# Altium schematic symbol library TI Amplifiers and Linear Operational Amplifier High Speed.SchLib: 1100 symbols (part 4 of 25) (continued)
## OPA842ID
designator U?
Wideband, Low Distortion, Unity Gain Stable, Voltage Feedback Operational Amplifier, 7 to 12 V, -40 to 85 degC, 8-pin SOIC (D8), Green (RoHS & no Sb/Br); Manufacturer: Texas Instruments; PartNumber: OPA842ID; 2nd Harmonic(dBc): 94; 3rd Harmonic(dBc): 93; @ MHz: 5; Acl, min stable gain(V/V): 1; BW @ Acl(MHz): 400; Diff Gain(%): 0.003; Diff Phase(deg): 0.008; Iib(Max)(nA): 37000; Io(Typ)(mA): 100; Iq per channel(Max)(mA): 22.5; Settling Time (0.1%)(Typ)(ns): 15; Sub Family: High Output Current Amplifier (>=50mA), High Speed Amplifier (>=50MHz); THD (Fc is 1 MHz)(Typ)(dB): -100; Vio(Max)(mV): 1.2; Vn at Flatband(Typ)(nV/rtHz): 2.7; Vs(Max)(V): 12; Vs(Min)(V): 7; DatasheetVersion: SBOS267D; PackageVersion: 4040047-3/M, 06/2011; PackageReference: D8; PackageDescription: 8-Pin Plastic Small Outline, Body 4.9 x 3.9 mm, Pitch 1.27 mm; Supplier 1: Digi-Key; Supplier Part Number 1: 296-14175-5-ND; Supplier 2: Farnell; Supplier Part Number 2: 1212330; Supplier 3: Newark; Supplier Part Number 3: 01M8439; Supplier 4: Newark; Supplier Part Number 4: 21H3994; Supplier 5: Mouser; Supplier Part Number 5: 595-OPA842ID; Eco-Plan: Green (RoHS & no Sb/Br); Number of Channels: 1; Slew Rate(Typ)(V/us): 400; Mounting Technology: Surface Mount; Code_JEDEC: MS-012; ComponentLink1Description: Manufacturer URL; ComponentLink1URL: http://www.ti.com/; ComponentLink2Description: Datasheet; ComponentLink2URL: http://www.ti.com/general/docs/lit/getliterature.tsp?genericPartNumber=OPA842&fileType=pdf; ComponentLink3Description: Package Specification; ComponentLink3URL: http://www.ti.com/litv/pdf/msoi002j
footprint TI-D8_N (SOIC, 8-Leads, Body 4.9x3.9mm, Pitch 1.27mm, IPC Medium Density)
footprint TI-D8_L (SOIC, 8-Leads, Body 4.9x3.9mm, Pitch 1.27mm, IPC High Density)
footprint TI-D8_M (SOIC, 8-Leads, Body 4.9x3.9mm, Pitch 1.27mm, IPC Low Density)
part A pins: 2 IN- (in), 3 IN+ (in), 4 VS- (power), 6 OUT (out), 7 VS+ (power)
part B pins: 1 NC, 5 NC, 8 NC

## OPA842IDBVR
designator U?
Wideband, Low Distortion, Unity Gain Stable, Voltage Feedback Operational Amplifier, 7 to 12 V, -40 to 85 degC, 5-pin SOT23 (DBV5), Green (RoHS & no Sb/Br); Manufacturer: Texas Instruments; PartNumber: OPA842IDBVR; 2nd Harmonic(dBc): 94; 3rd Harmonic(dBc): 93; @ MHz: 5; Acl, min stable gain(V/V): 1; BW @ Acl(MHz): 400; Diff Gain(%): 0.003; Diff Phase(deg): 0.008; Iib(Max)(nA): 37000; Io(Typ)(mA): 100; Iq per channel(Max)(mA): 22.5; Settling Time (0.1%)(Typ)(ns): 15; Sub Family: High Output Current Amplifier (>=50mA), High Speed Amplifier (>=50MHz); THD (Fc is 1 MHz)(Typ)(dB): -100; Vio(Max)(mV): 1.2; Vn at Flatband(Typ)(nV/rtHz): 2.7; Vs(Max)(V): 12; Vs(Min)(V): 7; DatasheetVersion: SBOS267D; PackageVersion: 4073253-4/K, 03/2006; PackageReference: DBV5; PackageDescription: 5-Pin Plastic Small Outline, Body 1.6 x 2.9 mm, Pitch 0.95 mm; Supplier 1: Digi-Key; Supplier Part Number 1: OPA842IDBVR-ND; Supplier 2: Mouser; Supplier Part Number 2: 595-OPA842IDBVR; Eco-Plan: Green (RoHS & no Sb/Br); Number of Channels: 1; Slew Rate(Typ)(V/us): 400; Mounting Technology: Surface Mount; Code_JEDEC: MO-178; ComponentLink1Description: Manufacturer URL; ComponentLink1URL: http://www.ti.com/; ComponentLink2Description: Datasheet; ComponentLink2URL: http://www.ti.com/general/docs/lit/getliterature.tsp?genericPartNumber=OPA842&fileType=pdf; ComponentLink3Description: Package Specification; ComponentLink3URL: http://www.ti.com/litv/pdf/mpds018i
footprint TI-DBV5_N (SOT23, 5-Leads, Body 2.9x1.6mm, Pitch 0.95mm, IPC Medium Density)
footprint TI-DBV5_L (SOT23, 5-Leads, Body 2.9x1.6mm, Pitch 0.95mm, IPC High Density)
footprint TI-DBV5_M (SOT23, 5-Leads, Body 2.9x1.6mm, Pitch 0.95mm, IPC Low Density)
pins: 1 OUT (out), 2 VS- (power), 3 IN+ (in), 4 IN- (in), 5 VS+ (power)

## OPA842IDBVRG4
designator U?
Wideband, Low Distortion, Unity Gain Stable, Voltage Feedback Operational Amplifier, 7 to 12 V, -40 to 85 degC, 5-pin SOT23 (DBV5), Green (RoHS & no Sb/Br); Manufacturer: Texas Instruments; PartNumber: OPA842IDBVRG4; 2nd Harmonic(dBc): 94; 3rd Harmonic(dBc): 93; @ MHz: 5; Acl, min stable gain(V/V): 1; BW @ Acl(MHz): 400; Diff Gain(%): 0.003; Diff Phase(deg): 0.008; Iib(Max)(nA): 37000; Io(Typ)(mA): 100; Iq per channel(Max)(mA): 22.5; Settling Time (0.1%)(Typ)(ns): 15; Sub Family: High Output Current Amplifier (>=50mA), High Speed Amplifier (>=50MHz); THD (Fc is 1 MHz)(Typ)(dB): -100; Vio(Max)(mV): 1.2; Vn at Flatband(Typ)(nV/rtHz): 2.7; Vs(Max)(V): 12; Vs(Min)(V): 7; DatasheetVersion: SBOS267D; PackageVersion: 4073253-4/K, 03/2006; PackageReference: DBV5; PackageDescription: 5-Pin Plastic Small Outline, Body 1.6 x 2.9 mm, Pitch 0.95 mm; Supplier 1: Digi-Key; Supplier Part Number 1: OPA842IDBVRG4-ND; Supplier 2: Mouser; Supplier Part Number 2: 595-OPA842IDBVRG4; Eco-Plan: Green (RoHS & no Sb/Br); Number of Channels: 1; Slew Rate(Typ)(V/us): 400; Mounting Technology: Surface Mount; Code_JEDEC: MO-178; ComponentLink1Description: Manufacturer URL; ComponentLink1URL: http://www.ti.com/; ComponentLink2Description: Datasheet; ComponentLink2URL: http://www.ti.com/general/docs/lit/getliterature.tsp?genericPartNumber=OPA842&fileType=pdf; ComponentLink3Description: Package Specification; ComponentLink3URL: http://www.ti.com/litv/pdf/mpds018i
footprint TI-DBV5_N (SOT23, 5-Leads, Body 2.9x1.6mm, Pitch 0.95mm, IPC Medium Density)
footprint TI-DBV5_L (SOT23, 5-Leads, Body 2.9x1.6mm, Pitch 0.95mm, IPC High Density)
footprint TI-DBV5_M (SOT23, 5-Leads, Body 2.9x1.6mm, Pitch 0.95mm, IPC Low Density)
pins: 1 OUT (out), 2 VS- (power), 3 IN+ (in), 4 IN- (in), 5 VS+ (power)

## OPA842IDBVT
designator U?
Wideband, Low Distortion, Unity Gain Stable, Voltage Feedback Operational Amplifier, 7 to 12 V, -40 to 85 degC, 5-pin SOT23 (DBV5), Green (RoHS & no Sb/Br); Manufacturer: Texas Instruments; PartNumber: OPA842IDBVT; 2nd Harmonic(dBc): 94; 3rd Harmonic(dBc): 93; @ MHz: 5; Acl, min stable gain(V/V): 1; BW @ Acl(MHz): 400; Diff Gain(%): 0.003; Diff Phase(deg): 0.008; Iib(Max)(nA): 37000; Io(Typ)(mA): 100; Iq per channel(Max)(mA): 22.5; Settling Time (0.1%)(Typ)(ns): 15; Sub Family: High Output Current Amplifier (>=50mA), High Speed Amplifier (>=50MHz); THD (Fc is 1 MHz)(Typ)(dB): -100; Vio(Max)(mV): 1.2; Vn at Flatband(Typ)(nV/rtHz): 2.7; Vs(Max)(V): 12; Vs(Min)(V): 7; DatasheetVersion: SBOS267D; PackageVersion: 4073253-4/K, 03/2006; PackageReference: DBV5; PackageDescription: 5-Pin Plastic Small Outline, Body 1.6 x 2.9 mm, Pitch 0.95 mm; Supplier 1: Digi-Key; Supplier Part Number 1: 296-14176-2-ND; Supplier 2: Digi-Key; Supplier Part Number 2: 296-14176-1-ND; Supplier 3: Digi-Key; Supplier Part Number 3: 296-14176-6-ND; Supplier 4: Farnell; Supplier Part Number 4: 8434298; Supplier 5: Newark; Supplier Part Number 5: 21H3996; Supplier 6: Mouser; Supplier Part Number 6: 595-OPA842IDBVT; Eco-Plan: Green (RoHS & no Sb/Br); Number of Channels: 1; Slew Rate(Typ)(V/us): 400; Mounting Technology: Surface Mount; Code_JEDEC: MO-178; ComponentLink1Description: Manufacturer URL; ComponentLink1URL: http://www.ti.com/; ComponentLink2Description: Datasheet; ComponentLink2URL: http://www.ti.com/general/docs/lit/getliterature.tsp?genericPartNumber=OPA842&fileType=pdf; ComponentLink3Description: Package Specification; ComponentLink3URL: http://www.ti.com/litv/pdf/mpds018i
footprint TI-DBV5_N (SOT23, 5-Leads, Body 2.9x1.6mm, Pitch 0.95mm, IPC Medium Density)
footprint TI-DBV5_L (SOT23, 5-Leads, Body 2.9x1.6mm, Pitch 0.95mm, IPC High Density)
footprint TI-DBV5_M (SOT23, 5-Leads, Body 2.9x1.6mm, Pitch 0.95mm, IPC Low Density)
pins: 1 OUT (out), 2 VS- (power), 3 IN+ (in), 4 IN- (in), 5 VS+ (power)

## OPA842IDBVTG4
designator U?
Wideband, Low Distortion, Unity Gain Stable, Voltage Feedback Operational Amplifier, 7 to 12 V, -40 to 85 degC, 5-pin SOT23 (DBV5), Green (RoHS & no Sb/Br); Manufacturer: Texas Instruments; PartNumber: OPA842IDBVTG4; 2nd Harmonic(dBc): 94; 3rd Harmonic(dBc): 93; @ MHz: 5; Acl, min stable gain(V/V): 1; BW @ Acl(MHz): 400; Diff Gain(%): 0.003; Diff Phase(deg): 0.008; Iib(Max)(nA): 37000; Io(Typ)(mA): 100; Iq per channel(Max)(mA): 22.5; Settling Time (0.1%)(Typ)(ns): 15; Sub Family: High Output Current Amplifier (>=50mA), High Speed Amplifier (>=50MHz); THD (Fc is 1 MHz)(Typ)(dB): -100; Vio(Max)(mV): 1.2; Vn at Flatband(Typ)(nV/rtHz): 2.7; Vs(Max)(V): 12; Vs(Min)(V): 7; DatasheetVersion: SBOS267D; PackageVersion: 4073253-4/K, 03/2006; PackageReference: DBV5; PackageDescription: 5-Pin Plastic Small Outline, Body 1.6 x 2.9 mm, Pitch 0.95 mm; Supplier 1: Digi-Key; Supplier Part Number 1: OPA842IDBVTG4-ND; Supplier 2: Mouser; Supplier Part Number 2: 595-OPA842IDBVTG4; Eco-Plan: Green (RoHS & no Sb/Br); Number of Channels: 1; Slew Rate(Typ)(V/us): 400; Mounting Technology: Surface Mount; Code_JEDEC: MO-178; ComponentLink1Description: Manufacturer URL; ComponentLink1URL: http://www.ti.com/; ComponentLink2Description: Datasheet; ComponentLink2URL: http://www.ti.com/general/docs/lit/getliterature.tsp?genericPartNumber=OPA842&fileType=pdf; ComponentLink3Description: Package Specification; ComponentLink3URL: http://www.ti.com/litv/pdf/mpds018i
footprint TI-DBV5_N (SOT23, 5-Leads, Body 2.9x1.6mm, Pitch 0.95mm, IPC Medium Density)
footprint TI-DBV5_L (SOT23, 5-Leads, Body 2.9x1.6mm, Pitch 0.95mm, IPC High Density)
footprint TI-DBV5_M (SOT23, 5-Leads, Body 2.9x1.6mm, Pitch 0.95mm, IPC Low Density)
pins: 1 OUT (out), 2 VS- (power), 3 IN+ (in), 4 IN- (in), 5 VS+ (power)

## OPA842IDG4
designator U?
Wideband, Low Distortion, Unity Gain Stable, Voltage Feedback Operational Amplifier, 7 to 12 V, -40 to 85 degC, 8-pin SOIC (D8), Green (RoHS & no Sb/Br); Manufacturer: Texas Instruments; PartNumber: OPA842IDG4; 2nd Harmonic(dBc): 94; 3rd Harmonic(dBc): 93; @ MHz: 5; Acl, min stable gain(V/V): 1; BW @ Acl(MHz): 400; Diff Gain(%): 0.003; Diff Phase(deg): 0.008; Iib(Max)(nA): 37000; Io(Typ)(mA): 100; Iq per channel(Max)(mA): 22.5; Settling Time (0.1%)(Typ)(ns): 15; Sub Family: High Output Current Amplifier (>=50mA), High Speed Amplifier (>=50MHz); THD (Fc is 1 MHz)(Typ)(dB): -100; Vio(Max)(mV): 1.2; Vn at Flatband(Typ)(nV/rtHz): 2.7; Vs(Max)(V): 12; Vs(Min)(V): 7; DatasheetVersion: SBOS267D; PackageVersion: 4040047-3/M, 06/2011; PackageReference: D8; PackageDescription: 8-Pin Plastic Small Outline, Body 4.9 x 3.9 mm, Pitch 1.27 mm; Supplier 1: Digi-Key; Supplier Part Number 1: OPA842IDG4-ND; Supplier 2: Mouser; Supplier Part Number 2: 595-OPA842IDG4; Eco-Plan: Green (RoHS & no Sb/Br); Number of Channels: 1; Slew Rate(Typ)(V/us): 400; Mounting Technology: Surface Mount; Code_JEDEC: MS-012; ComponentLink1Description: Manufacturer URL; ComponentLink1URL: http://www.ti.com/; ComponentLink2Description: Datasheet; ComponentLink2URL: http://www.ti.com/general/docs/lit/getliterature.tsp?genericPartNumber=OPA842&fileType=pdf; ComponentLink3Description: Package Specification; ComponentLink3URL: http://www.ti.com/litv/pdf/msoi002j
footprint TI-D8_N (SOIC, 8-Leads, Body 4.9x3.9mm, Pitch 1.27mm, IPC Medium Density)
footprint TI-D8_L (SOIC, 8-Leads, Body 4.9x3.9mm, Pitch 1.27mm, IPC High Density)
footprint TI-D8_M (SOIC, 8-Leads, Body 4.9x3.9mm, Pitch 1.27mm, IPC Low Density)
part A pins: 2 IN- (in), 3 IN+ (in), 4 VS- (power), 6 OUT (out), 7 VS+ (power)
part B pins: 1 NC, 5 NC, 8 NC

## OPA842IDR
designator U?
Wideband, Low Distortion, Unity Gain Stable, Voltage Feedback Operational Amplifier, 7 to 12 V, -40 to 85 degC, 8-pin SOIC (D8), Green (RoHS & no Sb/Br); Manufacturer: Texas Instruments; PartNumber: OPA842IDR; 2nd Harmonic(dBc): 94; 3rd Harmonic(dBc): 93; @ MHz: 5; Acl, min stable gain(V/V): 1; BW @ Acl(MHz): 400; Diff Gain(%): 0.003; Diff Phase(deg): 0.008; Iib(Max)(nA): 37000; Io(Typ)(mA): 100; Iq per channel(Max)(mA): 22.5; Settling Time (0.1%)(Typ)(ns): 15; Sub Family: High Output Current Amplifier (>=50mA), High Speed Amplifier (>=50MHz); THD (Fc is 1 MHz)(Typ)(dB): -100; Vio(Max)(mV): 1.2; Vn at Flatband(Typ)(nV/rtHz): 2.7; Vs(Max)(V): 12; Vs(Min)(V): 7; DatasheetVersion: SBOS267D; PackageVersion: 4040047-3/M, 06/2011; PackageReference: D8; PackageDescription: 8-Pin Plastic Small Outline, Body 4.9 x 3.9 mm, Pitch 1.27 mm; Supplier 1: Digi-Key; Supplier Part Number 1: OPA842IDR-ND; Supplier 2: Mouser; Supplier Part Number 2: 595-OPA842IDR; Eco-Plan: Green (RoHS & no Sb/Br); Number of Channels: 1; Slew Rate(Typ)(V/us): 400; Mounting Technology: Surface Mount; Code_JEDEC: MS-012; ComponentLink1Description: Manufacturer URL; ComponentLink1URL: http://www.ti.com/; ComponentLink2Description: Datasheet; ComponentLink2URL: http://www.ti.com/general/docs/lit/getliterature.tsp?genericPartNumber=OPA842&fileType=pdf; ComponentLink3Description: Package Specification; ComponentLink3URL: http://www.ti.com/litv/pdf/msoi002j
footprint TI-D8_N (SOIC, 8-Leads, Body 4.9x3.9mm, Pitch 1.27mm, IPC Medium Density)
footprint TI-D8_L (SOIC, 8-Leads, Body 4.9x3.9mm, Pitch 1.27mm, IPC High Density)
footprint TI-D8_M (SOIC, 8-Leads, Body 4.9x3.9mm, Pitch 1.27mm, IPC Low Density)
part A pins: 2 IN- (in), 3 IN+ (in), 4 VS- (power), 6 OUT (out), 7 VS+ (power)
part B pins: 1 NC, 5 NC, 8 NC

## OPA842IDRG4
designator U?
Wideband, Low Distortion, Unity Gain Stable, Voltage Feedback Operational Amplifier, 7 to 12 V, -40 to 85 degC, 8-pin SOIC (D8), Green (RoHS & no Sb/Br); Manufacturer: Texas Instruments; PartNumber: OPA842IDRG4; 2nd Harmonic(dBc): 94; 3rd Harmonic(dBc): 93; @ MHz: 5; Acl, min stable gain(V/V): 1; BW @ Acl(MHz): 350; Diff Gain(%): 0.003; Diff Phase(deg): 0.008; Iib(Max)(nA): 37000; Io(Typ)(mA): 100; Iq per channel(Max)(mA): 22.5; Settling Time (0.1%)(Typ)(ns): 15; Slew Rate(Typ)(V/us): 400; Sub Family: High Output Current Amplifier (>=50mA), High Speed Amplifier (>=50MHz); THD (Fc is 1 MHz)(Typ)(dB): -100; Vio(Max)(mV): 1.5; Vn at Flatband(Typ)(nV/rtHz): 3.1; Vs(Max)(V): 12; Vs(Min)(V): 7; DatasheetVersion: SBOS267D; PackageVersion: 4040047-3/M, 06/2011; PackageReference: D8; PackageDescription: 8-Pin Plastic Small Outline, Body 4.9 x 3.9 mm, Pitch 1.27 mm; Supplier 1: Digi-Key; Supplier Part Number 1: OPA842IDRG4-ND; Supplier 2: Mouser; Supplier Part Number 2: 595-OPA842IDRG4; Eco-Plan: Green (RoHS & no Sb/Br); Number of Channels: 1; Mounting Technology: Surface Mount; Code_JEDEC: MS-012; ComponentLink1Description: Manufacturer URL; ComponentLink1URL: http://www.ti.com/; ComponentLink2Description: Datasheet; ComponentLink2URL: http://www.ti.com/general/docs/lit/getliterature.tsp?genericPartNumber=OPA842&fileType=pdf; ComponentLink3Description: Package Specification; ComponentLink3URL: http://www.ti.com/litv/pdf/msoi002j
footprint TI-D8_N (SOIC, 8-Leads, Body 4.9x3.9mm, Pitch 1.27mm, IPC Medium Density)
footprint TI-D8_L (SOIC, 8-Leads, Body 4.9x3.9mm, Pitch 1.27mm, IPC High Density)
footprint TI-D8_M (SOIC, 8-Leads, Body 4.9x3.9mm, Pitch 1.27mm, IPC Low Density)
part A pins: 2 IN- (in), 3 IN+ (in), 4 VS- (power), 6 OUT (out), 7 VS+ (power)
part B pins: 1 NC, 5 NC, 8 NC

## OPA843ID
designator U?
Wideband, Low Distortion, Medium Gain, Voltage Feedback Operational Amplifier, 8 to 12 V, -40 to 85 degC, 8-pin SOIC (D8), Green (RoHS & no Sb/Br); Manufacturer: Texas Instruments; PartNumber: OPA843ID; 2nd Harmonic(dBc): 96; 3rd Harmonic(dBc): 110; @ MHz: 5; Acl, min stable gain(V/V): 3; BW @ Acl(MHz): 500; Diff Gain(%): 0.001; Diff Phase(deg): 0.012; Iib(Max)(nA): 37000; Io(Typ)(mA): 100; Iq per channel(Max)(mA): 22.5; Number of Channels: 1; Settling Time (0.1%)(Typ)(ns): 7.5; Slew Rate(Typ)(V/us): 1000; Sub Family: High Output Current Amplifier (>=50mA), High Speed Amplifier (>=50MHz); THD (Fc is 1 MHz)(Typ)(dB): -95; Vio(Max)(mV): 1.2; Vn at Flatband(Typ)(nV/rtHz): 2; Vs(Max)(V): 12; Vs(Min)(V): 8; DatasheetVersion: SBOS268C; PackageVersion: 4040047-3/M, 06/2011; PackageReference: D8; PackageDescription: 8-Pin Plastic Small Outline, Body 4.9 x 3.9 mm, Pitch 1.27 mm; Supplier 1: Digi-Key; Supplier Part Number 1: 296-14177-5-ND; Supplier 2: Farnell; Supplier Part Number 2: 8434301; Supplier 3: Newark; Supplier Part Number 3: 21H3998; Supplier 4: Mouser; Supplier Part Number 4: 595-OPA843ID; Eco-Plan: Green (RoHS & no Sb/Br); Mounting Technology: Surface Mount; Code_JEDEC: MS-012; ComponentLink1Description: Manufacturer URL; ComponentLink1URL: http://www.ti.com/; ComponentLink2Description: Datasheet; ComponentLink2URL: http://www.ti.com/general/docs/lit/getliterature.tsp?genericPartNumber=OPA843&fileType=pdf; ComponentLink3Description: Package Specification; ComponentLink3URL: http://www.ti.com/litv/pdf/msoi002j
footprint TI-D8_N (SOIC, 8-Leads, Body 4.9x3.9mm, Pitch 1.27mm, IPC Medium Density)
footprint TI-D8_L (SOIC, 8-Leads, Body 4.9x3.9mm, Pitch 1.27mm, IPC High Density)
footprint TI-D8_M (SOIC, 8-Leads, Body 4.9x3.9mm, Pitch 1.27mm, IPC Low Density)
part A pins: 2 IN- (in), 3 IN+ (in), 4 VS- (power), 6 OUT (out), 7 VS+ (power)
part B pins: 1 NC, 5 NC, 8 NC

## OPA843IDBVR
designator U?
Wideband, Low Distortion, Medium Gain, Voltage Feedback Operational Amplifier, 8 to 12 V, -40 to 85 degC, 5-pin SOT23 (DBV5), Green (RoHS & no Sb/Br); Manufacturer: Texas Instruments; PartNumber: OPA843IDBVR; 2nd Harmonic(dBc): 96; 3rd Harmonic(dBc): 110; @ MHz: 5; Acl, min stable gain(V/V): 3; BW @ Acl(MHz): 500; Diff Gain(%): 0.001; Diff Phase(deg): 0.012; Iib(Max)(nA): 37000; Io(Typ)(mA): 100; Iq per channel(Max)(mA): 22.5; Number of Channels: 1; Settling Time (0.1%)(Typ)(ns): 7.5; Slew Rate(Typ)(V/us): 1000; Sub Family: High Output Current Amplifier (>=50mA), High Speed Amplifier (>=50MHz); THD (Fc is 1 MHz)(Typ)(dB): -95; Vio(Max)(mV): 1.2; Vn at Flatband(Typ)(nV/rtHz): 2; Vs(Max)(V): 12; Vs(Min)(V): 8; DatasheetVersion: SBOS268C; PackageVersion: 4073253-4/K, 03/2006; PackageReference: DBV5; PackageDescription: 5-Pin Plastic Small Outline, Body 1.6 x 2.9 mm, Pitch 0.95 mm; Supplier 1: Digi-Key; Supplier Part Number 1: OPA843IDBVR-ND; Supplier 2: Mouser; Supplier Part Number 2: 595-OPA843IDBVR; Eco-Plan: Green (RoHS & no Sb/Br); Mounting Technology: Surface Mount; Code_JEDEC: MO-178; ComponentLink1Description: Manufacturer URL; ComponentLink1URL: http://www.ti.com/; ComponentLink2Description: Datasheet; ComponentLink2URL: http://www.ti.com/general/docs/lit/getliterature.tsp?genericPartNumber=OPA843&fileType=pdf; ComponentLink3Description: Package Specification; ComponentLink3URL: http://www.ti.com/litv/pdf/mpds018i
footprint TI-DBV5_N (SOT23, 5-Leads, Body 2.9x1.6mm, Pitch 0.95mm, IPC Medium Density)
footprint TI-DBV5_L (SOT23, 5-Leads, Body 2.9x1.6mm, Pitch 0.95mm, IPC High Density)
footprint TI-DBV5_M (SOT23, 5-Leads, Body 2.9x1.6mm, Pitch 0.95mm, IPC Low Density)
pins: 1 OUT (out), 2 VS- (power), 3 IN+ (in), 4 IN- (in), 5 VS+ (power)

## OPA843IDBVRG4
designator U?
Wideband, Low Distortion, Medium Gain, Voltage Feedback Operational Amplifier, 8 to 12 V, -40 to 85 degC, 5-pin SOT23 (DBV5), Green (RoHS & no Sb/Br); Manufacturer: Texas Instruments; PartNumber: OPA843IDBVRG4; 2nd Harmonic(dBc): 96; 3rd Harmonic(dBc): 110; @ MHz: 5; Acl, min stable gain(V/V): 3; BW @ Acl(MHz): 500; Diff Gain(%): 0.001; Diff Phase(deg): 0.012; Iib(Max)(nA): 37000; Io(Typ)(mA): 100; Iq per channel(Max)(mA): 22.5; Number of Channels: 1; Settling Time (0.1%)(Typ)(ns): 7.5; Slew Rate(Typ)(V/us): 1000; Sub Family: High Output Current Amplifier (>=50mA), High Speed Amplifier (>=50MHz); THD (Fc is 1 MHz)(Typ)(dB): -95; Vio(Max)(mV): 1.2; Vn at Flatband(Typ)(nV/rtHz): 2; Vs(Max)(V): 12; Vs(Min)(V): 8; DatasheetVersion: SBOS268C; PackageVersion: 4073253-4/K, 03/2006; PackageReference: DBV5; PackageDescription: 5-Pin Plastic Small Outline, Body 1.6 x 2.9 mm, Pitch 0.95 mm; Supplier 1: Digi-Key; Supplier Part Number 1: OPA843IDBVRG4-ND; Supplier 2: Mouser; Supplier Part Number 2: 595-OPA843IDBVRG4; Eco-Plan: Green (RoHS & no Sb/Br); Mounting Technology: Surface Mount; Code_JEDEC: MO-178; ComponentLink1Description: Manufacturer URL; ComponentLink1URL: http://www.ti.com/; ComponentLink2Description: Datasheet; ComponentLink2URL: http://www.ti.com/general/docs/lit/getliterature.tsp?genericPartNumber=OPA843&fileType=pdf; ComponentLink3Description: Package Specification; ComponentLink3URL: http://www.ti.com/litv/pdf/mpds018i
footprint TI-DBV5_N (SOT23, 5-Leads, Body 2.9x1.6mm, Pitch 0.95mm, IPC Medium Density)
footprint TI-DBV5_L (SOT23, 5-Leads, Body 2.9x1.6mm, Pitch 0.95mm, IPC High Density)
footprint TI-DBV5_M (SOT23, 5-Leads, Body 2.9x1.6mm, Pitch 0.95mm, IPC Low Density)
pins: 1 OUT (out), 2 VS- (power), 3 IN+ (in), 4 IN- (in), 5 VS+ (power)

## OPA843IDBVT
designator U?
Wideband, Low Distortion, Medium Gain, Voltage Feedback Operational Amplifier, 8 to 12 V, -40 to 85 degC, 5-pin SOT23 (DBV5), Green (RoHS & no Sb/Br); Manufacturer: Texas Instruments; PartNumber: OPA843IDBVT; 2nd Harmonic(dBc): 96; 3rd Harmonic(dBc): 110; @ MHz: 5; Acl, min stable gain(V/V): 3; BW @ Acl(MHz): 500; Diff Gain(%): 0.001; Diff Phase(deg): 0.012; Iib(Max)(nA): 37000; Io(Typ)(mA): 100; Iq per channel(Max)(mA): 22.5; Number of Channels: 1; Settling Time (0.1%)(Typ)(ns): 7.5; Slew Rate(Typ)(V/us): 1000; Sub Family: High Output Current Amplifier (>=50mA), High Speed Amplifier (>=50MHz); THD (Fc is 1 MHz)(Typ)(dB): -95; Vio(Max)(mV): 1.2; Vn at Flatband(Typ)(nV/rtHz): 2; Vs(Max)(V): 12; Vs(Min)(V): 8; DatasheetVersion: SBOS268C; PackageVersion: 4073253-4/K, 03/2006; PackageReference: DBV5; PackageDescription: 5-Pin Plastic Small Outline, Body 1.6 x 2.9 mm, Pitch 0.95 mm; Supplier 1: Digi-Key; Supplier Part Number 1: 296-14178-2-ND; Supplier 2: Digi-Key; Supplier Part Number 2: 296-14178-1-ND; Supplier 3: Digi-Key; Supplier Part Number 3: 296-14178-6-ND; Supplier 4: Newark; Supplier Part Number 4: 21H4000; Supplier 5: Mouser; Supplier Part Number 5: 595-OPA843IDBVT; Eco-Plan: Green (RoHS & no Sb/Br); Mounting Technology: Surface Mount; Code_JEDEC: MO-178; ComponentLink1Description: Manufacturer URL; ComponentLink1URL: http://www.ti.com/; ComponentLink2Description: Datasheet; ComponentLink2URL: http://www.ti.com/general/docs/lit/getliterature.tsp?genericPartNumber=OPA843&fileType=pdf; ComponentLink3Description: Package Specification; ComponentLink3URL: http://www.ti.com/litv/pdf/mpds018i
footprint TI-DBV5_N (SOT23, 5-Leads, Body 2.9x1.6mm, Pitch 0.95mm, IPC Medium Density)
footprint TI-DBV5_L (SOT23, 5-Leads, Body 2.9x1.6mm, Pitch 0.95mm, IPC High Density)
footprint TI-DBV5_M (SOT23, 5-Leads, Body 2.9x1.6mm, Pitch 0.95mm, IPC Low Density)
pins: 1 OUT (out), 2 VS- (power), 3 IN+ (in), 4 IN- (in), 5 VS+ (power)

## OPA843IDBVTG4
designator U?
Wideband, Low Distortion, Medium Gain, Voltage Feedback Operational Amplifier, 8 to 12 V, -40 to 85 degC, 5-pin SOT23 (DBV5), Green (RoHS & no Sb/Br); Manufacturer: Texas Instruments; PartNumber: OPA843IDBVTG4; 2nd Harmonic(dBc): 96; 3rd Harmonic(dBc): 110; @ MHz: 5; Acl, min stable gain(V/V): 3; BW @ Acl(MHz): 500; Diff Gain(%): 0.001; Diff Phase(deg): 0.012; Iib(Max)(nA): 37000; Io(Typ)(mA): 100; Iq per channel(Max)(mA): 22.5; Number of Channels: 1; Settling Time (0.1%)(Typ)(ns): 7.5; Slew Rate(Typ)(V/us): 1000; Sub Family: High Output Current Amplifier (>=50mA), High Speed Amplifier (>=50MHz); THD (Fc is 1 MHz)(Typ)(dB): -95; Vio(Max)(mV): 1.2; Vn at Flatband(Typ)(nV/rtHz): 2; Vs(Max)(V): 12; Vs(Min)(V): 8; DatasheetVersion: SBOS268C; PackageVersion: 4073253-4/K, 03/2006; PackageReference: DBV5; PackageDescription: 5-Pin Plastic Small Outline, Body 1.6 x 2.9 mm, Pitch 0.95 mm; Supplier 1: Digi-Key; Supplier Part Number 1: OPA843IDBVTG4-ND; Supplier 2: Newark; Supplier Part Number 2: 54K0193; Supplier 3: Mouser; Supplier Part Number 3: 595-OPA843IDBVTG4; Eco-Plan: Green (RoHS & no Sb/Br); Mounting Technology: Surface Mount; Code_JEDEC: MO-178; ComponentLink1Description: Manufacturer URL; ComponentLink1URL: http://www.ti.com/; ComponentLink2Description: Datasheet; ComponentLink2URL: http://www.ti.com/general/docs/lit/getliterature.tsp?genericPartNumber=OPA843&fileType=pdf; ComponentLink3Description: Package Specification; ComponentLink3URL: http://www.ti.com/litv/pdf/mpds018i
footprint TI-DBV5_N (SOT23, 5-Leads, Body 2.9x1.6mm, Pitch 0.95mm, IPC Medium Density)
footprint TI-DBV5_L (SOT23, 5-Leads, Body 2.9x1.6mm, Pitch 0.95mm, IPC High Density)
footprint TI-DBV5_M (SOT23, 5-Leads, Body 2.9x1.6mm, Pitch 0.95mm, IPC Low Density)
pins: 1 OUT (out), 2 VS- (power), 3 IN+ (in), 4 IN- (in), 5 VS+ (power)

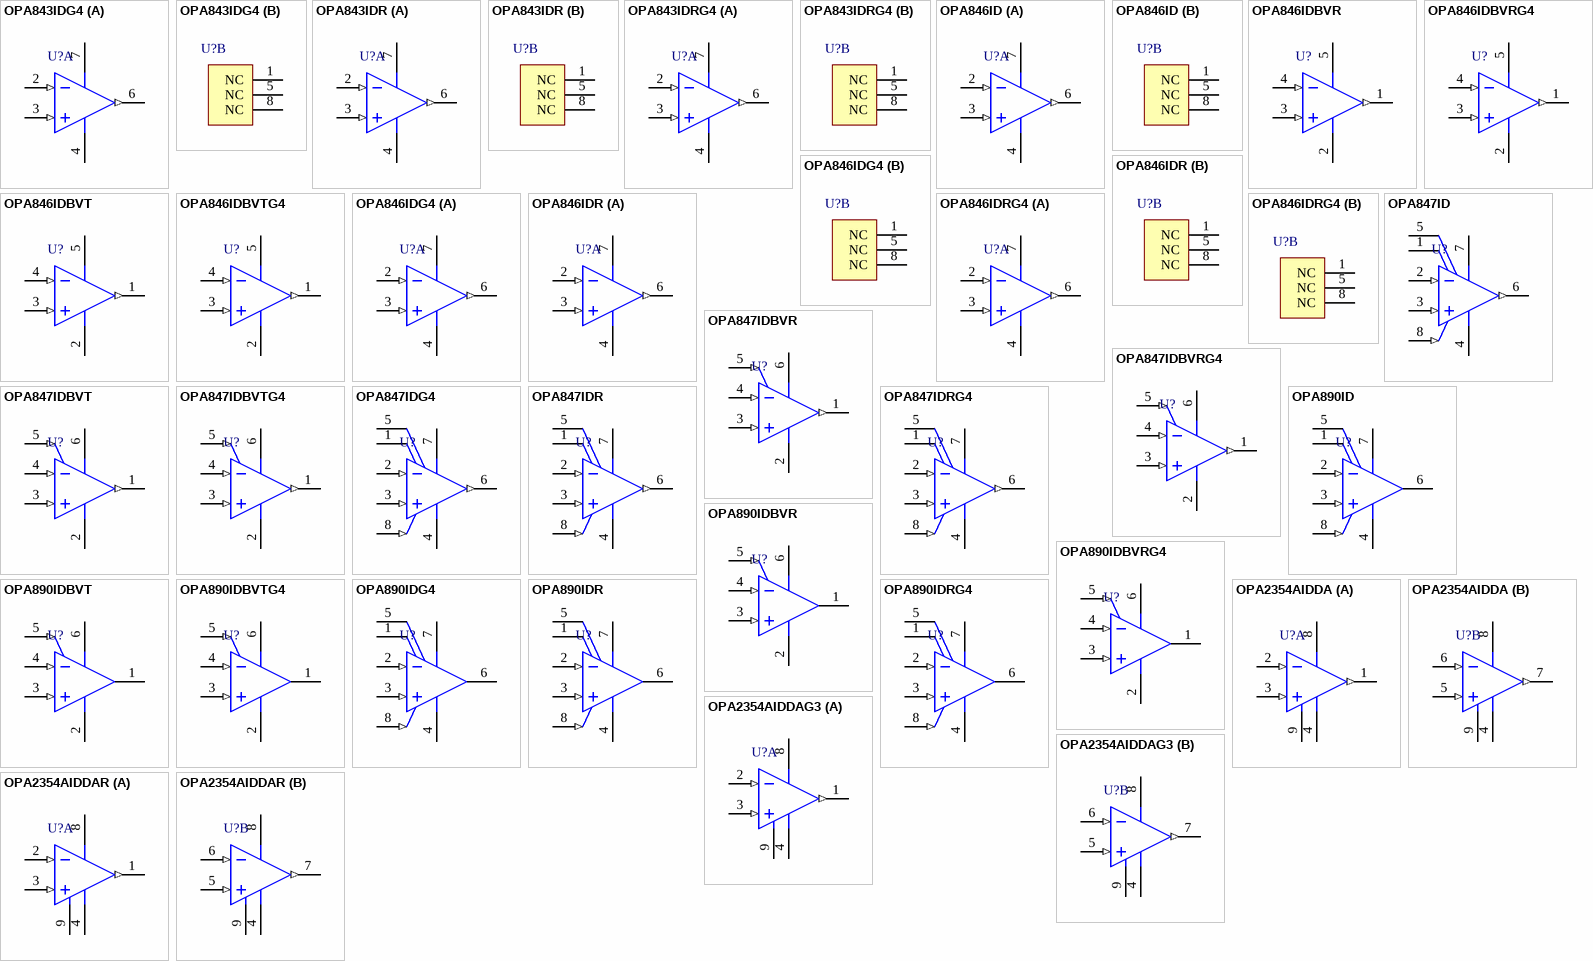
[diagram p6: symbols OPA843IDG4 to OPA2354AIDDAR]

## OPA843IDG4
designator U?
Wideband, Low Distortion, Medium Gain, Voltage Feedback Operational Amplifier, 8 to 12 V, -40 to 85 degC, 8-pin SOIC (D8), Green (RoHS & no Sb/Br); Manufacturer: Texas Instruments; PartNumber: OPA843IDG4; 2nd Harmonic(dBc): 96; 3rd Harmonic(dBc): 110; @ MHz: 5; Acl, min stable gain(V/V): 3; BW @ Acl(MHz): 500; Diff Gain(%): 0.001; Diff Phase(deg): 0.012; Iib(Max)(nA): 37000; Io(Typ)(mA): 100; Iq per channel(Max)(mA): 22.5; Number of Channels: 1; Settling Time (0.1%)(Typ)(ns): 7.5; Slew Rate(Typ)(V/us): 1000; Sub Family: High Output Current Amplifier (>=50mA), High Speed Amplifier (>=50MHz); THD (Fc is 1 MHz)(Typ)(dB): -95; Vio(Max)(mV): 1.2; Vn at Flatband(Typ)(nV/rtHz): 2; Vs(Max)(V): 12; Vs(Min)(V): 8; DatasheetVersion: SBOS268C; PackageVersion: 4040047-3/M, 06/2011; PackageReference: D8; PackageDescription: 8-Pin Plastic Small Outline, Body 4.9 x 3.9 mm, Pitch 1.27 mm; Supplier 1: Digi-Key; Supplier Part Number 1: OPA843IDG4-ND; Supplier 2: Newark; Supplier Part Number 2: 70K4122; Supplier 3: Mouser; Supplier Part Number 3: 595-OPA843IDG4; Eco-Plan: Green (RoHS & no Sb/Br); Mounting Technology: Surface Mount; Code_JEDEC: MS-012; ComponentLink1Description: Manufacturer URL; ComponentLink1URL: http://www.ti.com/; ComponentLink2Description: Datasheet; ComponentLink2URL: http://www.ti.com/general/docs/lit/getliterature.tsp?genericPartNumber=OPA843&fileType=pdf; ComponentLink3Description: Package Specification; ComponentLink3URL: http://www.ti.com/litv/pdf/msoi002j
footprint TI-D8_N (SOIC, 8-Leads, Body 4.9x3.9mm, Pitch 1.27mm, IPC Medium Density)
footprint TI-D8_L (SOIC, 8-Leads, Body 4.9x3.9mm, Pitch 1.27mm, IPC High Density)
footprint TI-D8_M (SOIC, 8-Leads, Body 4.9x3.9mm, Pitch 1.27mm, IPC Low Density)
part A pins: 2 IN- (in), 3 IN+ (in), 4 VS- (power), 6 OUT (out), 7 VS+ (power)
part B pins: 1 NC, 5 NC, 8 NC

## OPA843IDR
designator U?
Wideband, Low Distortion, Medium Gain, Voltage Feedback Operational Amplifier, 8 to 12 V, -40 to 85 degC, 8-pin SOIC (D8), Green (RoHS & no Sb/Br); Manufacturer: Texas Instruments; PartNumber: OPA843IDR; 2nd Harmonic(dBc): 96; 3rd Harmonic(dBc): 110; @ MHz: 5; Acl, min stable gain(V/V): 3; BW @ Acl(MHz): 500; Diff Gain(%): 0.001; Diff Phase(deg): 0.012; Iib(Max)(nA): 37000; Io(Typ)(mA): 100; Iq per channel(Max)(mA): 22.5; Number of Channels: 1; Settling Time (0.1%)(Typ)(ns): 7.5; Slew Rate(Typ)(V/us): 1000; Sub Family: High Output Current Amplifier (>=50mA), High Speed Amplifier (>=50MHz); THD (Fc is 1 MHz)(Typ)(dB): -95; Vio(Max)(mV): 1.2; Vn at Flatband(Typ)(nV/rtHz): 2; Vs(Max)(V): 12; Vs(Min)(V): 8; DatasheetVersion: SBOS268C; PackageVersion: 4040047-3/M, 06/2011; PackageReference: D8; PackageDescription: 8-Pin Plastic Small Outline, Body 4.9 x 3.9 mm, Pitch 1.27 mm; Supplier 1: Digi-Key; Supplier Part Number 1: OPA843IDR-ND; Supplier 2: Newark; Supplier Part Number 2: 21H4001; Supplier 3: Mouser; Supplier Part Number 3: 595-OPA843IDR; Eco-Plan: Green (RoHS & no Sb/Br); Mounting Technology: Surface Mount; Code_JEDEC: MS-012; ComponentLink1Description: Manufacturer URL; ComponentLink1URL: http://www.ti.com/; ComponentLink2Description: Datasheet; ComponentLink2URL: http://www.ti.com/general/docs/lit/getliterature.tsp?genericPartNumber=OPA843&fileType=pdf; ComponentLink3Description: Package Specification; ComponentLink3URL: http://www.ti.com/litv/pdf/msoi002j
footprint TI-D8_N (SOIC, 8-Leads, Body 4.9x3.9mm, Pitch 1.27mm, IPC Medium Density)
footprint TI-D8_L (SOIC, 8-Leads, Body 4.9x3.9mm, Pitch 1.27mm, IPC High Density)
footprint TI-D8_M (SOIC, 8-Leads, Body 4.9x3.9mm, Pitch 1.27mm, IPC Low Density)
part A pins: 2 IN- (in), 3 IN+ (in), 4 VS- (power), 6 OUT (out), 7 VS+ (power)
part B pins: 1 NC, 5 NC, 8 NC

## OPA843IDRG4
designator U?
Wideband, Low Distortion, Medium Gain, Voltage Feedback Operational Amplifier, 8 to 12 V, -40 to 85 degC, 8-pin SOIC (D8), Green (RoHS & no Sb/Br); Manufacturer: Texas Instruments; PartNumber: OPA843IDRG4; 2nd Harmonic(dBc): 96; 3rd Harmonic(dBc): 110; @ MHz: 5; Acl, min stable gain(V/V): 3; BW @ Acl(MHz): 500; Diff Gain(%): 0.001; Diff Phase(deg): 0.012; Iib(Max)(nA): 3700; Io(Typ)(mA): 100; Iq per channel(Max)(mA): 22.5; Number of Channels: 1; Settling Time (0.1%)(Typ)(ns): 7.5; Slew Rate(Typ)(V/us): 1000; Sub Family: High Output Current Amplifier (>=50mA), High Speed Amplifier (>=50MHz); THD (Fc is 1 MHz)(Typ)(dB): -95; Vio(Max)(mV): 1.5; Vn at Flatband(Typ)(nV/rtHz): 2; Vs(Max)(V): 12; Vs(Min)(V): 8; DatasheetVersion: SBOS268C; PackageVersion: 4040047-3/M, 06/2011; PackageReference: D8; PackageDescription: 8-Pin Plastic Small Outline, Body 4.9 x 3.9 mm, Pitch 1.27 mm; Supplier 1: Digi-Key; Supplier Part Number 1: OPA843IDRG4-ND; Supplier 2: Mouser; Supplier Part Number 2: 595-OPA843IDRG4; Eco-Plan: Green (RoHS & no Sb/Br); Mounting Technology: Surface Mount; Code_JEDEC: MS-012; ComponentLink1Description: Manufacturer URL; ComponentLink1URL: http://www.ti.com/; ComponentLink2Description: Datasheet; ComponentLink2URL: http://www.ti.com/general/docs/lit/getliterature.tsp?genericPartNumber=OPA843&fileType=pdf; ComponentLink3Description: Package Specification; ComponentLink3URL: http://www.ti.com/litv/pdf/msoi002j
footprint TI-D8_N (SOIC, 8-Leads, Body 4.9x3.9mm, Pitch 1.27mm, IPC Medium Density)
footprint TI-D8_L (SOIC, 8-Leads, Body 4.9x3.9mm, Pitch 1.27mm, IPC High Density)
footprint TI-D8_M (SOIC, 8-Leads, Body 4.9x3.9mm, Pitch 1.27mm, IPC Low Density)
part A pins: 2 IN- (in), 3 IN+ (in), 4 VS- (power), 6 OUT (out), 7 VS+ (power)
part B pins: 1 NC, 5 NC, 8 NC

## OPA846ID
designator U?
Wideband, Low Noise, Voltage Feedback Operational Amplifier, 10 to 12 V, -40 to 85 degC, 8-pin SOIC (D8), Green (RoHS & no Sb/Br); Manufacturer: Texas Instruments; PartNumber: OPA846ID; 2nd Harmonic(dBc): 100; 3rd Harmonic(dBc): 112; @ MHz: 5; Acl, min stable gain(V/V): 7; BW @ Acl(MHz): 500; Diff Gain(%): 0.02; Iib(Max)(nA): 21000; Io(Typ)(mA): 80; Iq per channel(Max)(mA): 13.2; Number of Channels: 1; Settling Time (0.1%)(Typ)(ns): 15; Slew Rate(Typ)(V/us): 625; Sub Family: High Output Current Amplifier (>=50mA), High Speed Amplifier (>=50MHz); THD (Fc is 1 MHz)(Typ)(dB): -92; Vio(Max)(mV): 0.6; Vn at Flatband(Typ)(nV/rtHz): 1.2; Vs(Max)(V): 12; Vs(Min)(V): 10; DatasheetVersion: SBOS250E; PackageVersion: 4040047-3/M, 06/2011; PackageReference: D8; PackageDescription: 8-Pin Plastic Small Outline, Body 4.9 x 3.9 mm, Pitch 1.27 mm; Supplier 1: Digi-Key; Supplier Part Number 1: 296-14775-5-ND; Supplier 2: Farnell; Supplier Part Number 2: 1212331; Supplier 3: Newark; Supplier Part Number 3: 01M8440; Supplier 4: Newark; Supplier Part Number 4: 61H5165; Supplier 5: Mouser; Supplier Part Number 5: 595-OPA846ID; Diff Phase(deg): 0.02; Eco-Plan: Green (RoHS & no Sb/Br); Mounting Technology: Surface Mount; Code_JEDEC: MS-012; ComponentLink1Description: Manufacturer URL; ComponentLink1URL: http://www.ti.com/; ComponentLink2Description: Datasheet; ComponentLink2URL: http://www.ti.com/general/docs/lit/getliterature.tsp?genericPartNumber=OPA846&fileType=pdf; ComponentLink3Description: Package Specification; ComponentLink3URL: http://www.ti.com/litv/pdf/msoi002j
footprint TI-D8_N (SOIC, 8-Leads, Body 4.9x3.9mm, Pitch 1.27mm, IPC Medium Density)
footprint TI-D8_L (SOIC, 8-Leads, Body 4.9x3.9mm, Pitch 1.27mm, IPC High Density)
footprint TI-D8_M (SOIC, 8-Leads, Body 4.9x3.9mm, Pitch 1.27mm, IPC Low Density)
part A pins: 2 IN- (in), 3 IN+ (in), 4 VS- (power), 6 OUT (out), 7 VS+ (power)
part B pins: 1 NC, 5 NC, 8 NC

## OPA846IDBVR
designator U?
Wideband, Low Noise, Voltage Feedback Operational Amplifier, 10 to 12 V, -40 to 85 degC, 5-pin SOT23 (DBV5), Green (RoHS & no Sb/Br); Manufacturer: Texas Instruments; PartNumber: OPA846IDBVR; 2nd Harmonic(dBc): 100; 3rd Harmonic(dBc): 112; @ MHz: 5; Acl, min stable gain(V/V): 7; BW @ Acl(MHz): 500; Diff Gain(%): 0.02; Iib(Max)(nA): 21000; Io(Typ)(mA): 80; Iq per channel(Max)(mA): 13.2; Number of Channels: 1; Settling Time (0.1%)(Typ)(ns): 15; Slew Rate(Typ)(V/us): 625; Sub Family: High Output Current Amplifier (>=50mA), High Speed Amplifier (>=50MHz); THD (Fc is 1 MHz)(Typ)(dB): -92; Vio(Max)(mV): 0.6; Vn at Flatband(Typ)(nV/rtHz): 1.2; Vs(Max)(V): 12; Vs(Min)(V): 10; DatasheetVersion: SBOS250E; PackageVersion: 4073253-4/K, 03/2006; PackageReference: DBV5; PackageDescription: 5-Pin Plastic Small Outline, Body 1.6 x 2.9 mm, Pitch 0.95 mm; Supplier 1: Digi-Key; Supplier Part Number 1: OPA846IDBVR-ND; Supplier 2: Newark; Supplier Part Number 2: 61H5166; Supplier 3: Mouser; Supplier Part Number 3: 595-OPA846IDBVR; Diff Phase(deg): 0.02; Eco-Plan: Green (RoHS & no Sb/Br); Mounting Technology: Surface Mount; Code_JEDEC: MO-178; ComponentLink1Description: Manufacturer URL; ComponentLink1URL: http://www.ti.com/; ComponentLink2Description: Datasheet; ComponentLink2URL: http://www.ti.com/general/docs/lit/getliterature.tsp?genericPartNumber=OPA846&fileType=pdf; ComponentLink3Description: Package Specification; ComponentLink3URL: http://www.ti.com/litv/pdf/mpds018i
footprint TI-DBV5_N (SOT23, 5-Leads, Body 2.9x1.6mm, Pitch 0.95mm, IPC Medium Density)
footprint TI-DBV5_L (SOT23, 5-Leads, Body 2.9x1.6mm, Pitch 0.95mm, IPC High Density)
footprint TI-DBV5_M (SOT23, 5-Leads, Body 2.9x1.6mm, Pitch 0.95mm, IPC Low Density)
pins: 1 OUT (out), 2 VS- (power), 3 IN+ (in), 4 IN- (in), 5 VS+ (power)

## OPA846IDBVRG4
designator U?
Wideband, Low Noise, Voltage Feedback Operational Amplifier, 10 to 12 V, -40 to 85 degC, 5-pin SOT23 (DBV5), Green (RoHS & no Sb/Br); Manufacturer: Texas Instruments; PartNumber: OPA846IDBVRG4; 2nd Harmonic(dBc): 100; 3rd Harmonic(dBc): 112; @ MHz: 5; Acl, min stable gain(V/V): 7; BW @ Acl(MHz): 500; Diff Gain(%): 0.02; Iib(Max)(nA): 21000; Io(Typ)(mA): 80; Iq per channel(Max)(mA): 13.2; Number of Channels: 1; Settling Time (0.1%)(Typ)(ns): 15; Slew Rate(Typ)(V/us): 625; Sub Family: High Output Current Amplifier (>=50mA), High Speed Amplifier (>=50MHz); THD (Fc is 1 MHz)(Typ)(dB): -92; Vio(Max)(mV): 0.6; Vn at Flatband(Typ)(nV/rtHz): 1.2; Vs(Max)(V): 12; Vs(Min)(V): 10; DatasheetVersion: SBOS250E; PackageVersion: 4073253-4/K, 03/2006; PackageReference: DBV5; PackageDescription: 5-Pin Plastic Small Outline, Body 1.6 x 2.9 mm, Pitch 0.95 mm; Supplier 1: Digi-Key; Supplier Part Number 1: OPA846IDBVRG4-ND; Supplier 2: Mouser; Supplier Part Number 2: 595-OPA846IDBVRG4; Diff Phase(deg): 0.02; Eco-Plan: Green (RoHS & no Sb/Br); Mounting Technology: Surface Mount; Code_JEDEC: MO-178; ComponentLink1Description: Manufacturer URL; ComponentLink1URL: http://www.ti.com/; ComponentLink2Description: Datasheet; ComponentLink2URL: http://www.ti.com/general/docs/lit/getliterature.tsp?genericPartNumber=OPA846&fileType=pdf; ComponentLink3Description: Package Specification; ComponentLink3URL: http://www.ti.com/litv/pdf/mpds018i
footprint TI-DBV5_N (SOT23, 5-Leads, Body 2.9x1.6mm, Pitch 0.95mm, IPC Medium Density)
footprint TI-DBV5_L (SOT23, 5-Leads, Body 2.9x1.6mm, Pitch 0.95mm, IPC High Density)
footprint TI-DBV5_M (SOT23, 5-Leads, Body 2.9x1.6mm, Pitch 0.95mm, IPC Low Density)
pins: 1 OUT (out), 2 VS- (power), 3 IN+ (in), 4 IN- (in), 5 VS+ (power)

## OPA846IDBVT
designator U?
Wideband, Low Noise, Voltage Feedback Operational Amplifier, 10 to 12 V, -40 to 85 degC, 5-pin SOT23 (DBV5), Green (RoHS & no Sb/Br); Manufacturer: Texas Instruments; PartNumber: OPA846IDBVT; 2nd Harmonic(dBc): 100; 3rd Harmonic(dBc): 112; @ MHz: 5; Acl, min stable gain(V/V): 7; BW @ Acl(MHz): 500; Diff Gain(%): 0.02; Iib(Max)(nA): 21000; Io(Typ)(mA): 80; Iq per channel(Max)(mA): 13.2; Number of Channels: 1; Settling Time (0.1%)(Typ)(ns): 15; Slew Rate(Typ)(V/us): 625; Sub Family: High Output Current Amplifier (>=50mA), High Speed Amplifier (>=50MHz); THD (Fc is 1 MHz)(Typ)(dB): -92; Vio(Max)(mV): 0.6; Vn at Flatband(Typ)(nV/rtHz): 1.2; Vs(Max)(V): 12; Vs(Min)(V): 10; DatasheetVersion: SBOS250E; PackageVersion: 4073253-4/K, 03/2006; PackageReference: DBV5; PackageDescription: 5-Pin Plastic Small Outline, Body 1.6 x 2.9 mm, Pitch 0.95 mm; Supplier 1: Digi-Key; Supplier Part Number 1: 296-14776-2-ND; Supplier 2: Digi-Key; Supplier Part Number 2: 296-14776-1-ND; Supplier 3: Digi-Key; Supplier Part Number 3: 296-14776-6-ND; Supplier 4: Farnell; Supplier Part Number 4: 8434328; Supplier 5: Newark; Supplier Part Number 5: 86W6072; Supplier 6: Newark; Supplier Part Number 6: 61H5167; Supplier 7: Mouser; Supplier Part Number 7: 595-OPA846IDBVT; Diff Phase(deg): 0.02; Eco-Plan: Green (RoHS & no Sb/Br); Mounting Technology: Surface Mount; Code_JEDEC: MO-178; ComponentLink1Description: Manufacturer URL; ComponentLink1URL: http://www.ti.com/; ComponentLink2Description: Datasheet; ComponentLink2URL: http://www.ti.com/general/docs/lit/getliterature.tsp?genericPartNumber=OPA846&fileType=pdf; ComponentLink3Description: Package Specification; ComponentLink3URL: http://www.ti.com/litv/pdf/mpds018i
footprint TI-DBV5_N (SOT23, 5-Leads, Body 2.9x1.6mm, Pitch 0.95mm, IPC Medium Density)
footprint TI-DBV5_L (SOT23, 5-Leads, Body 2.9x1.6mm, Pitch 0.95mm, IPC High Density)
footprint TI-DBV5_M (SOT23, 5-Leads, Body 2.9x1.6mm, Pitch 0.95mm, IPC Low Density)
pins: 1 OUT (out), 2 VS- (power), 3 IN+ (in), 4 IN- (in), 5 VS+ (power)

## OPA846IDBVTG4
designator U?
Wideband, Low Noise, Voltage Feedback Operational Amplifier, 10 to 12 V, -40 to 85 degC, 5-pin SOT23 (DBV5), Green (RoHS & no Sb/Br); Manufacturer: Texas Instruments; PartNumber: OPA846IDBVTG4; 2nd Harmonic(dBc): 100; 3rd Harmonic(dBc): 112; @ MHz: 5; Acl, min stable gain(V/V): 7; BW @ Acl(MHz): 500; Diff Gain(%): 0.02; Iib(Max)(nA): 21000; Io(Typ)(mA): 80; Iq per channel(Max)(mA): 13.2; Number of Channels: 1; Settling Time (0.1%)(Typ)(ns): 15; Slew Rate(Typ)(V/us): 625; Sub Family: High Output Current Amplifier (>=50mA), High Speed Amplifier (>=50MHz); THD (Fc is 1 MHz)(Typ)(dB): -92; Vio(Max)(mV): 0.6; Vn at Flatband(Typ)(nV/rtHz): 1.2; Vs(Max)(V): 12; Vs(Min)(V): 10; DatasheetVersion: SBOS250E; PackageVersion: 4073253-4/K, 03/2006; PackageReference: DBV5; PackageDescription: 5-Pin Plastic Small Outline, Body 1.6 x 2.9 mm, Pitch 0.95 mm; Supplier 1: Digi-Key; Supplier Part Number 1: OPA846IDBVTG4-ND; Supplier 2: Farnell; Supplier Part Number 2: 1207078; Supplier 3: Newark; Supplier Part Number 3: 81K3714; Supplier 4: Mouser; Supplier Part Number 4: 595-OPA846IDBVTG4; Diff Phase(deg): 0.02; Eco-Plan: Green (RoHS & no Sb/Br); Mounting Technology: Surface Mount; Code_JEDEC: MO-178; ComponentLink1Description: Manufacturer URL; ComponentLink1URL: http://www.ti.com/; ComponentLink2Description: Datasheet; ComponentLink2URL: http://www.ti.com/general/docs/lit/getliterature.tsp?genericPartNumber=OPA846&fileType=pdf; ComponentLink3Description: Package Specification; ComponentLink3URL: http://www.ti.com/litv/pdf/mpds018i
footprint TI-DBV5_N (SOT23, 5-Leads, Body 2.9x1.6mm, Pitch 0.95mm, IPC Medium Density)
footprint TI-DBV5_L (SOT23, 5-Leads, Body 2.9x1.6mm, Pitch 0.95mm, IPC High Density)
footprint TI-DBV5_M (SOT23, 5-Leads, Body 2.9x1.6mm, Pitch 0.95mm, IPC Low Density)
pins: 1 OUT (out), 2 VS- (power), 3 IN+ (in), 4 IN- (in), 5 VS+ (power)

## OPA846IDG4
designator U?
Wideband, Low Noise, Voltage Feedback Operational Amplifier, 10 to 12 V, -40 to 85 degC, 8-pin SOIC (D8), Green (RoHS & no Sb/Br); Manufacturer: Texas Instruments; PartNumber: OPA846IDG4; 2nd Harmonic(dBc): 100; 3rd Harmonic(dBc): 112; @ MHz: 5; Acl, min stable gain(V/V): 7; BW @ Acl(MHz): 500; Diff Gain(%): 0.02; Iib(Max)(nA): 21000; Io(Typ)(mA): 80; Iq per channel(Max)(mA): 13.2; Number of Channels: 1; Settling Time (0.1%)(Typ)(ns): 15; Slew Rate(Typ)(V/us): 625; Sub Family: High Output Current Amplifier (>=50mA), High Speed Amplifier (>=50MHz); THD (Fc is 1 MHz)(Typ)(dB): -92; Vio(Max)(mV): 0.6; Vn at Flatband(Typ)(nV/rtHz): 1.2; Vs(Max)(V): 12; Vs(Min)(V): 10; DatasheetVersion: SBOS250E; PackageVersion: 4040047-3/M, 06/2011; PackageReference: D8; PackageDescription: 8-Pin Plastic Small Outline, Body 4.9 x 3.9 mm, Pitch 1.27 mm; Supplier 1: Digi-Key; Supplier Part Number 1: OPA846IDG4-ND; Supplier 2: Mouser; Supplier Part Number 2: 595-OPA846IDG4; Diff Phase(deg): 0.02; Eco-Plan: Green (RoHS & no Sb/Br); Mounting Technology: Surface Mount; Code_JEDEC: MS-012; ComponentLink1Description: Manufacturer URL; ComponentLink1URL: http://www.ti.com/; ComponentLink2Description: Datasheet; ComponentLink2URL: http://www.ti.com/general/docs/lit/getliterature.tsp?genericPartNumber=OPA846&fileType=pdf; ComponentLink3Description: Package Specification; ComponentLink3URL: http://www.ti.com/litv/pdf/msoi002j
footprint TI-D8_N (SOIC, 8-Leads, Body 4.9x3.9mm, Pitch 1.27mm, IPC Medium Density)
footprint TI-D8_L (SOIC, 8-Leads, Body 4.9x3.9mm, Pitch 1.27mm, IPC High Density)
footprint TI-D8_M (SOIC, 8-Leads, Body 4.9x3.9mm, Pitch 1.27mm, IPC Low Density)
part A pins: 2 IN- (in), 3 IN+ (in), 4 VS- (power), 6 OUT (out), 7 VS+ (power)
part B pins: 1 NC, 5 NC, 8 NC

## OPA846IDR
designator U?
Wideband, Low Noise, Voltage Feedback Operational Amplifier, 10 to 12 V, -40 to 85 degC, 8-pin SOIC (D8), Green (RoHS & no Sb/Br); Manufacturer: Texas Instruments; PartNumber: OPA846IDR; 2nd Harmonic(dBc): 100; 3rd Harmonic(dBc): 112; @ MHz: 5; Acl, min stable gain(V/V): 7; BW @ Acl(MHz): 500; Diff Gain(%): 0.02; Iib(Max)(nA): 21000; Io(Typ)(mA): 80; Iq per channel(Max)(mA): 13.2; Number of Channels: 1; Settling Time (0.1%)(Typ)(ns): 15; Slew Rate(Typ)(V/us): 625; Sub Family: High Output Current Amplifier (>=50mA), High Speed Amplifier (>=50MHz); THD (Fc is 1 MHz)(Typ)(dB): -92; Vio(Max)(mV): 0.6; Vn at Flatband(Typ)(nV/rtHz): 1.2; Vs(Max)(V): 12; Vs(Min)(V): 10; DatasheetVersion: SBOS250E; PackageVersion: 4040047-3/M, 06/2011; PackageReference: D8; PackageDescription: 8-Pin Plastic Small Outline, Body 4.9 x 3.9 mm, Pitch 1.27 mm; Supplier 1: Digi-Key; Supplier Part Number 1: OPA846IDR-ND; Supplier 2: Mouser; Supplier Part Number 2: 595-OPA846IDR; Diff Phase(deg): 0.02; Eco-Plan: Green (RoHS & no Sb/Br); Mounting Technology: Surface Mount; Code_JEDEC: MS-012; ComponentLink1Description: Manufacturer URL; ComponentLink1URL: http://www.ti.com/; ComponentLink2Description: Datasheet; ComponentLink2URL: http://www.ti.com/general/docs/lit/getliterature.tsp?genericPartNumber=OPA846&fileType=pdf; ComponentLink3Description: Package Specification; ComponentLink3URL: http://www.ti.com/litv/pdf/msoi002j
footprint TI-D8_N (SOIC, 8-Leads, Body 4.9x3.9mm, Pitch 1.27mm, IPC Medium Density)
footprint TI-D8_L (SOIC, 8-Leads, Body 4.9x3.9mm, Pitch 1.27mm, IPC High Density)
footprint TI-D8_M (SOIC, 8-Leads, Body 4.9x3.9mm, Pitch 1.27mm, IPC Low Density)
part A pins: 2 IN- (in), 3 IN+ (in), 4 VS- (power), 6 OUT (out), 7 VS+ (power)
part B pins: 1 NC, 5 NC, 8 NC

## OPA846IDRG4
designator U?
Wideband, Low Noise, Voltage Feedback Operational Amplifier, 10 to 12 V, -40 to 85 degC, 8-pin SOIC (D8), Green (RoHS & no Sb/Br); Manufacturer: Texas Instruments; PartNumber: OPA846IDRG4; 2nd Harmonic(dBc): 100; 3rd Harmonic(dBc): 112; @ MHz: 5; Acl, min stable gain(V/V): 7; BW @ Acl(MHz): 500; Diff Gain(%): 0.02; Iib(Max)(nA): 21000; Io(Typ)(mA): 80; Iq per channel(Max)(mA): 13.2; Number of Channels: 1; Settling Time (0.1%)(Typ)(ns): 10; Slew Rate(Typ)(V/us): 625; Sub Family: High Output Current Amplifier (>=50mA), High Speed Amplifier (>=50MHz); THD (Fc is 1 MHz)(Typ)(dB): -92; Vio(Max)(mV): 0.6; Vn at Flatband(Typ)(nV/rtHz): 1.2; Vs(Max)(V): 12; DatasheetVersion: SBOS250E; PackageVersion: 4040047-3/M, 06/2011; PackageReference: D8; PackageDescription: 8-Pin Plastic Small Outline, Body 4.9 x 3.9 mm, Pitch 1.27 mm; Supplier 1: Digi-Key; Supplier Part Number 1: OPA846IDRG4-ND; Supplier 2: Mouser; Supplier Part Number 2: 595-OPA846IDRG4; Diff Phase(deg): 0.02; Eco-Plan: Green (RoHS & no Sb/Br); Vs(Min)(V): 10; Mounting Technology: Surface Mount; Code_JEDEC: MS-012; ComponentLink1Description: Manufacturer URL; ComponentLink1URL: http://www.ti.com/; ComponentLink2Description: Datasheet; ComponentLink2URL: http://www.ti.com/general/docs/lit/getliterature.tsp?genericPartNumber=OPA846&fileType=pdf; ComponentLink3Description: Package Specification; ComponentLink3URL: http://www.ti.com/litv/pdf/msoi002j
footprint TI-D8_N (SOIC, 8-Leads, Body 4.9x3.9mm, Pitch 1.27mm, IPC Medium Density)
footprint TI-D8_L (SOIC, 8-Leads, Body 4.9x3.9mm, Pitch 1.27mm, IPC High Density)
footprint TI-D8_M (SOIC, 8-Leads, Body 4.9x3.9mm, Pitch 1.27mm, IPC Low Density)
part A pins: 2 IN- (in), 3 IN+ (in), 4 VS- (power), 6 OUT (out), 7 VS+ (power)
part B pins: 1 NC, 5 NC, 8 NC

## OPA847ID
designator U?
Wideband, Ultra-Low Noise, Voltage Feedback Operational Amplifier with Shutdown, 10 to 12 V, -40 to 85 degC, 8-pin SOIC (D8), Green (RoHS & no Sb/Br); Manufacturer: Texas Instruments; PartNumber: OPA847ID; 2nd Harmonic(dBc): 105; 3rd Harmonic(dBc): 110; @ MHz: 5; Acl, min stable gain(V/V): 12; BW @ Acl(MHz): 600; Iib(Max)(nA): 42000; Io(Typ)(mA): 75; Iq per channel(Max)(mA): 18.9; Number of Channels: 1; Settling Time (0.1%)(Typ)(ns): 20; Slew Rate(Typ)(V/us): 950; Sub Family: High Output Current Amplifier (>=50mA), High Speed Amplifier (>=50MHz), Low Offset Voltage Amplifier (<=500uV); THD (Fc is 1 MHz)(Typ)(dB): -96; Vio(Max)(mV): 0.5; Vn at Flatband(Typ)(nV/rtHz): 0.85; Vs(Min)(V): 10; DatasheetVersion: SBOS251E; PackageVersion: 4040047-3/M, 06/2011; PackageReference: D8; PackageDescription: 8-Pin Plastic Small Outline, Body 4.9 x 3.9 mm, Pitch 1.27 mm; Supplier 1: Digi-Key; Supplier Part Number 1: 296-15171-5-ND; Supplier 2: Farnell; Supplier Part Number 2: 2118343; Supplier 3: Newark; Supplier Part Number 3: 04M6520; Supplier 4: Mouser; Supplier Part Number 4: 595-OPA847ID; Eco-Plan: Green (RoHS & no Sb/Br); Vs(Max)(V): 12; Mounting Technology: Surface Mount; Code_JEDEC: MS-012; ComponentLink1Description: Manufacturer URL; ComponentLink1URL: http://www.ti.com/; ComponentLink2Description: Datasheet; ComponentLink2URL: http://www.ti.com/general/docs/lit/getliterature.tsp?genericPartNumber=OPA847&fileType=pdf; ComponentLink3Description: Package Specification; ComponentLink3URL: http://www.ti.com/litv/pdf/msoi002j
footprint TI-D8_N (SOIC, 8-Leads, Body 4.9x3.9mm, Pitch 1.27mm, IPC Medium Density)
footprint TI-D8_L (SOIC, 8-Leads, Body 4.9x3.9mm, Pitch 1.27mm, IPC High Density)
footprint TI-D8_M (SOIC, 8-Leads, Body 4.9x3.9mm, Pitch 1.27mm, IPC Low Density)
pins: 1 NC, 2 IN- (in), 3 IN+ (in), 4 VS- (power), 5 NC, 6 OUT (out), 7 VS+ (power), 8 ~{DIS} (in)

## OPA847IDBVR
designator U?
Wideband, Ultra-Low Noise, Voltage Feedback Operational Amplifier with Shutdown, 10 to 12 V, -40 to 85 degC, 6-pin SOT23 (DBV6), Green (RoHS & no Sb/Br); Manufacturer: Texas Instruments; PartNumber: OPA847IDBVR; 2nd Harmonic(dBc): 105; 3rd Harmonic(dBc): 110; @ MHz: 5; Acl, min stable gain(V/V): 12; BW @ Acl(MHz): 600; Iib(Max)(nA): 42000; Io(Typ)(mA): 75; Iq per channel(Max)(mA): 18.9; Number of Channels: 1; Settling Time (0.1%)(Typ)(ns): 20; Slew Rate(Typ)(V/us): 950; Sub Family: High Output Current Amplifier (>=50mA), High Speed Amplifier (>=50MHz), Low Offset Voltage Amplifier (<=500uV); THD (Fc is 1 MHz)(Typ)(dB): -96; Vio(Max)(mV): 0.5; Vn at Flatband(Typ)(nV/rtHz): 0.85; Vs(Min)(V): 10; DatasheetVersion: SBOS251E; PackageVersion: 4073253-5/K, 03/2006; PackageReference: DBV6; PackageDescription: 6-Pin Plastic Small Outline, Body 1.6 x 2.9 mm, Pitch 0.95 mm; Supplier 1: Digi-Key; Supplier Part Number 1: OPA847IDBVR-ND; Supplier 2: Newark; Supplier Part Number 2: 73H4300; Supplier 3: Mouser; Supplier Part Number 3: 595-OPA847IDBVR; Eco-Plan: Green (RoHS & no Sb/Br); Vs(Max)(V): 12; Mounting Technology: Surface Mount; Code_JEDEC: MO-178; ComponentLink1Description: Manufacturer URL; ComponentLink1URL: http://www.ti.com/; ComponentLink2Description: Datasheet; ComponentLink2URL: http://www.ti.com/general/docs/lit/getliterature.tsp?genericPartNumber=OPA847&fileType=pdf; ComponentLink3Description: Package Specification; ComponentLink3URL: http://www.ti.com/litv/pdf/mpds026h
footprint TI-DBV6_N (SOT23, 6-Leads, Body 2.9x1.6mm, Pitch 0.95mm, IPC Medium Density)
footprint TI-DBV6_L (SOT23, 6-Leads, Body 2.9x1.6mm, Pitch 0.95mm, IPC High Density)
footprint TI-DBV6_M (SOT23, 6-Leads, Body 2.9x1.6mm, Pitch 0.95mm, IPC Low Density)
pins: 1 OUT (out), 2 VS- (power), 3 IN+ (in), 4 IN- (in), 5 ~{DIS} (in), 6 VS+ (power)